# Altium schematic symbol library jlcpcb_2025_04_capacitors_extended_0402.schlib: 3594 symbols (part 14 of 20) (continued)
## GJM1555C1H3R6CB01D
designator C?  Capacitance: 3.6pF  (hidden comment: *)
Capacitor, Ceramic (MLCC), 3.6pF, 50V, C0G, SMD 0402; Manufacturer: Murata Electronics; Manufacturer Part Number: GJM1555C1H3R6CB01D; Package Size: 0402; JLCPCB Basic Part: No; JLCPCB Part Number: C85882; Supplier 1: LCSC; Category: Capacitors - MLCC; Supplier Part Number 1: C85882; Voltage Rating: 50V; Temperature Coefficient: C0G; RoHS: Yes; ComponentLink1Description: Datasheet; ComponentLink1URL: https://wmsc.lcsc.com/wmsc/upload/file/pdf/v2/lcsc/2304140030_Murata-Electronics-GJM1555C1H3R6CB01D_C85882.pdf; ComponentLink2Description: JLCPCB Part URL; ComponentLink2URL: https://jlcpcb.com/partdetail/C85882; ComponentLink3Description: LCSC Part URL; ComponentLink3URL: https://lcsc.com/product-detail/Multilayer-Ceramic-Capacitors-MLCC---SMD-SMT_Murata-Electronics-Murata-Electronics-GJM1555C1H3R6CB01D_C85882.html
footprint CAP-0402 (0402 (1005M) Capacitor)
pins: 1, 2

## GJM1555C1H3R6WB01D
designator C?  Capacitance: 3.6pF  (hidden comment: *)
Capacitor, Ceramic (MLCC), 3.6pF, 50V, C0G, SMD 0402; Manufacturer: Murata Electronics; Manufacturer Part Number: GJM1555C1H3R6WB01D; Package Size: 0402; JLCPCB Basic Part: No; JLCPCB Part Number: C161321; Supplier 1: LCSC; Category: Capacitors - MLCC; Supplier Part Number 1: C161321; Voltage Rating: 50V; Temperature Coefficient: C0G; RoHS: Yes; ComponentLink1Description: Datasheet; ComponentLink1URL: https://wmsc.lcsc.com/wmsc/upload/file/pdf/v2/lcsc/1811081521_Murata-Electronics-GJM1555C1H3R6WB01D_C161321.pdf; ComponentLink2Description: JLCPCB Part URL; ComponentLink2URL: https://jlcpcb.com/partdetail/C161321; ComponentLink3Description: LCSC Part URL; ComponentLink3URL: https://lcsc.com/product-detail/Multilayer-Ceramic-Capacitors-MLCC---SMD-SMT_Murata-Electronics-Murata-Electronics-GJM1555C1H3R6WB01D_C161321.html
footprint CAP-0402 (0402 (1005M) Capacitor)
pins: 1, 2

## GJM1555C1H3R9BB01D
designator C?  Capacitance: 3.9pF  (hidden comment: *)
Capacitor, Ceramic (MLCC), 3.9pF, 50V, C0G, SMD 0402; Manufacturer: Murata Electronics; Manufacturer Part Number: GJM1555C1H3R9BB01D; Package Size: 0402; JLCPCB Basic Part: No; JLCPCB Part Number: C76907; Supplier 1: LCSC; Category: Capacitors - MLCC; Supplier Part Number 1: C76907; Voltage Rating: 50V; Temperature Coefficient: C0G; RoHS: Yes; ComponentLink1Description: Datasheet; ComponentLink1URL: https://wmsc.lcsc.com/wmsc/upload/file/pdf/v2/lcsc/2304140030_Murata-Electronics-GJM1555C1H3R9BB01D_C76907.pdf; ComponentLink2Description: JLCPCB Part URL; ComponentLink2URL: https://jlcpcb.com/partdetail/C76907; ComponentLink3Description: LCSC Part URL; ComponentLink3URL: https://lcsc.com/product-detail/Multilayer-Ceramic-Capacitors-MLCC---SMD-SMT_Murata-Electronics-Murata-Electronics-GJM1555C1H3R9BB01D_C76907.html
footprint CAP-0402 (0402 (1005M) Capacitor)
pins: 1, 2

## GJM1555C1H3R9CB01D
designator C?  Capacitance: 3.9pF  (hidden comment: *)
Capacitor, Ceramic (MLCC), 3.9pF, 50V, C0G, SMD 0402; Manufacturer: Murata Electronics; Manufacturer Part Number: GJM1555C1H3R9CB01D; Package Size: 0402; JLCPCB Basic Part: No; JLCPCB Part Number: C237290; Supplier 1: LCSC; Category: Capacitors - MLCC; Supplier Part Number 1: C237290; Voltage Rating: 50V; Temperature Coefficient: C0G; RoHS: Yes; ComponentLink1Description: Datasheet; ComponentLink1URL: https://wmsc.lcsc.com/wmsc/upload/file/pdf/v2/lcsc/2304140030_Murata-Electronics-GJM1555C1H3R9CB01D_C237290.pdf; ComponentLink2Description: JLCPCB Part URL; ComponentLink2URL: https://jlcpcb.com/partdetail/C237290; ComponentLink3Description: LCSC Part URL; ComponentLink3URL: https://lcsc.com/product-detail/Multilayer-Ceramic-Capacitors-MLCC---SMD-SMT_Murata-Electronics-Murata-Electronics-GJM1555C1H3R9CB01D_C237290.html
footprint CAP-0402 (0402 (1005M) Capacitor)
pins: 1, 2

## GJM1555C1H3R9WB01D
designator C?  Capacitance: 3.9pF  (hidden comment: *)
Capacitor, Ceramic (MLCC), 3.9pF, 50V, C0G, SMD 0402; Manufacturer: Murata Electronics; Manufacturer Part Number: GJM1555C1H3R9WB01D; Package Size: 0402; JLCPCB Basic Part: No; JLCPCB Part Number: C88893; Supplier 1: LCSC; Category: Capacitors - MLCC; Supplier Part Number 1: C88893; Voltage Rating: 50V; Temperature Coefficient: C0G; RoHS: Yes; ComponentLink1Description: Datasheet; ComponentLink1URL: https://wmsc.lcsc.com/wmsc/upload/file/pdf/v2/lcsc/2304140030_Murata-Electronics-GJM1555C1H3R9WB01D_C88893.pdf; ComponentLink2Description: JLCPCB Part URL; ComponentLink2URL: https://jlcpcb.com/partdetail/C88893; ComponentLink3Description: LCSC Part URL; ComponentLink3URL: https://lcsc.com/product-detail/Multilayer-Ceramic-Capacitors-MLCC---SMD-SMT_Murata-Electronics-Murata-Electronics-GJM1555C1H3R9WB01D_C88893.html
footprint CAP-0402 (0402 (1005M) Capacitor)
pins: 1, 2

## GJM1555C1H4R0BB01D
designator C?  Capacitance: 4pF  (hidden comment: *)
Capacitor, Ceramic (MLCC), 4pF, 50V, C0G, SMD 0402; Manufacturer: Murata Electronics; Manufacturer Part Number: GJM1555C1H4R0BB01D; Package Size: 0402; JLCPCB Basic Part: No; JLCPCB Part Number: C161323; Supplier 1: LCSC; Category: Capacitors - MLCC; Supplier Part Number 1: C161323; Voltage Rating: 50V; Temperature Coefficient: C0G; RoHS: Yes; ComponentLink1Description: Datasheet; ComponentLink1URL: https://wmsc.lcsc.com/wmsc/upload/file/pdf/v2/lcsc/1811081521_Murata-Electronics-GJM1555C1H4R0BB01D_C161323.pdf; ComponentLink2Description: JLCPCB Part URL; ComponentLink2URL: https://jlcpcb.com/partdetail/C161323; ComponentLink3Description: LCSC Part URL; ComponentLink3URL: https://lcsc.com/product-detail/Multilayer-Ceramic-Capacitors-MLCC---SMD-SMT_Murata-Electronics-Murata-Electronics-GJM1555C1H4R0BB01D_C161323.html
footprint CAP-0402 (0402 (1005M) Capacitor)
pins: 1, 2

## GJM1555C1H4R0CB01D
designator C?  Capacitance: 4pF  (hidden comment: *)
Capacitor, Ceramic (MLCC), 4pF, 50V, C0G, SMD 0402; Manufacturer: Murata Electronics; Manufacturer Part Number: GJM1555C1H4R0CB01D; Package Size: 0402; JLCPCB Basic Part: No; JLCPCB Part Number: C161324; Supplier 1: LCSC; Category: Capacitors - MLCC; Supplier Part Number 1: C161324; Voltage Rating: 50V; Temperature Coefficient: C0G; RoHS: Yes; ComponentLink1Description: Datasheet; ComponentLink1URL: https://wmsc.lcsc.com/wmsc/upload/file/pdf/v2/lcsc/2304140030_Murata-Electronics-GJM1555C1H4R0CB01D_C161324.pdf; ComponentLink2Description: JLCPCB Part URL; ComponentLink2URL: https://jlcpcb.com/partdetail/C161324; ComponentLink3Description: LCSC Part URL; ComponentLink3URL: https://lcsc.com/product-detail/Multilayer-Ceramic-Capacitors-MLCC---SMD-SMT_Murata-Electronics-Murata-Electronics-GJM1555C1H4R0CB01D_C161324.html
footprint CAP-0402 (0402 (1005M) Capacitor)
pins: 1, 2

## GJM1555C1H4R0WB01D
designator C?  Capacitance: 4pF  (hidden comment: *)
Capacitor, Ceramic (MLCC), 4pF, null, null, SMD 0402; Manufacturer: Murata Electronics; Manufacturer Part Number: GJM1555C1H4R0WB01D; Package Size: 0402; JLCPCB Basic Part: No; JLCPCB Part Number: C883563; Supplier 1: LCSC; Category: Capacitors - MLCC; Supplier Part Number 1: C883563; Voltage Rating: null; Temperature Coefficient: null; RoHS: Yes; ComponentLink1Description: Datasheet; ComponentLink1URL: https://wmsc.lcsc.com/wmsc/upload/file/pdf/v2/lcsc/2012231842_Murata-Electronics-GJM1555C1H4R0WB01D_C883563.pdf; ComponentLink2Description: JLCPCB Part URL; ComponentLink2URL: https://jlcpcb.com/partdetail/C883563; ComponentLink3Description: LCSC Part URL; ComponentLink3URL: https://lcsc.com/product-detail/Multilayer-Ceramic-Capacitors-MLCC---SMD-SMT_Murata-Electronics-Murata-Electronics-GJM1555C1H4R0WB01D_C883563.html
footprint CAP-0402 (0402 (1005M) Capacitor)
pins: 1, 2

## GJM1555C1H4R3BB01D
designator C?  Capacitance: 4.3pF  (hidden comment: *)
Capacitor, Ceramic (MLCC), 4.3pF, null, null, SMD 0402; Manufacturer: Murata Electronics; Manufacturer Part Number: GJM1555C1H4R3BB01D; Package Size: 0402; JLCPCB Basic Part: No; JLCPCB Part Number: C426034; Supplier 1: LCSC; Category: Capacitors - MLCC; Supplier Part Number 1: C426034; Voltage Rating: null; Temperature Coefficient: null; RoHS: Yes; ComponentLink1Description: Datasheet; ComponentLink1URL: https://wmsc.lcsc.com/wmsc/upload/file/pdf/v2/lcsc/2304140030_Murata-Electronics-GJM1555C1H4R3BB01D_C426034.pdf; ComponentLink2Description: JLCPCB Part URL; ComponentLink2URL: https://jlcpcb.com/partdetail/C426034; ComponentLink3Description: LCSC Part URL; ComponentLink3URL: https://lcsc.com/product-detail/Multilayer-Ceramic-Capacitors-MLCC---SMD-SMT_Murata-Electronics-Murata-Electronics-GJM1555C1H4R3BB01D_C426034.html
footprint CAP-0402 (0402 (1005M) Capacitor)
pins: 1, 2

## GJM1555C1H4R3CB01D
designator C?  Capacitance: 4.3pF  (hidden comment: *)
Capacitor, Ceramic (MLCC), 4.3pF, 50V, C0G, SMD 0402; Manufacturer: Murata Electronics; Manufacturer Part Number: GJM1555C1H4R3CB01D; Package Size: 0402; JLCPCB Basic Part: No; JLCPCB Part Number: C161325; Supplier 1: LCSC; Category: Capacitors - MLCC; Supplier Part Number 1: C161325; Voltage Rating: 50V; Temperature Coefficient: C0G; RoHS: Yes; ComponentLink1Description: Datasheet; ComponentLink1URL: https://wmsc.lcsc.com/wmsc/upload/file/pdf/v2/lcsc/2304140030_Murata-Electronics-GJM1555C1H4R3CB01D_C161325.pdf; ComponentLink2Description: JLCPCB Part URL; ComponentLink2URL: https://jlcpcb.com/partdetail/C161325; ComponentLink3Description: LCSC Part URL; ComponentLink3URL: https://lcsc.com/product-detail/Multilayer-Ceramic-Capacitors-MLCC---SMD-SMT_Murata-Electronics-Murata-Electronics-GJM1555C1H4R3CB01D_C161325.html
footprint CAP-0402 (0402 (1005M) Capacitor)
pins: 1, 2

## GJM1555C1H4R3WB01D
designator C?  Capacitance: 4.3pF  (hidden comment: *)
Capacitor, Ceramic (MLCC), 4.3pF, 50V, C0G, SMD 0402; Manufacturer: Murata Electronics; Manufacturer Part Number: GJM1555C1H4R3WB01D; Package Size: 0402; JLCPCB Basic Part: No; JLCPCB Part Number: C161326; Supplier 1: LCSC; Category: Capacitors - MLCC; Supplier Part Number 1: C161326; Voltage Rating: 50V; Temperature Coefficient: C0G; RoHS: Yes; ComponentLink1Description: Datasheet; ComponentLink1URL: https://wmsc.lcsc.com/wmsc/upload/file/pdf/v2/lcsc/2304140030_Murata-Electronics-GJM1555C1H4R3WB01D_C161326.pdf; ComponentLink2Description: JLCPCB Part URL; ComponentLink2URL: https://jlcpcb.com/partdetail/C161326; ComponentLink3Description: LCSC Part URL; ComponentLink3URL: https://lcsc.com/product-detail/Multilayer-Ceramic-Capacitors-MLCC---SMD-SMT_Murata-Electronics-Murata-Electronics-GJM1555C1H4R3WB01D_C161326.html
footprint CAP-0402 (0402 (1005M) Capacitor)
pins: 1, 2

## GJM1555C1H4R4BB01D
designator C?  Capacitance: 4.4pF  (hidden comment: *)
Capacitor, Ceramic (MLCC), 4.4pF, 50V, null, SMD 0402; Manufacturer: Murata Electronics; Manufacturer Part Number: GJM1555C1H4R4BB01D; Package Size: 0402; JLCPCB Basic Part: No; JLCPCB Part Number: C2203151; Supplier 1: LCSC; Category: Capacitors - MLCC; Supplier Part Number 1: C2203151; Voltage Rating: 50V; Temperature Coefficient: null; RoHS: Yes; ComponentLink1Description: Datasheet; ComponentLink1URL: https://wmsc.lcsc.com/wmsc/upload/file/pdf/v2/lcsc/2104170907_Murata-Electronics-GJM1555C1H4R4BB01D_C2203151.pdf; ComponentLink2Description: JLCPCB Part URL; ComponentLink2URL: https://jlcpcb.com/partdetail/C2203151; ComponentLink3Description: LCSC Part URL; ComponentLink3URL: https://lcsc.com/product-detail/Multilayer-Ceramic-Capacitors-MLCC---SMD-SMT_Murata-Electronics-Murata-Electronics-GJM1555C1H4R4BB01D_C2203151.html
footprint CAP-0402 (0402 (1005M) Capacitor)
pins: 1, 2

## GJM1555C1H4R5BB01D
designator C?  Capacitance: 4.5pF  (hidden comment: *)
Capacitor, Ceramic (MLCC), 4.5pF, 50V, C0G, SMD 0402; Manufacturer: Murata Electronics; Manufacturer Part Number: GJM1555C1H4R5BB01D; Package Size: 0402; JLCPCB Basic Part: No; JLCPCB Part Number: C882561; Supplier 1: LCSC; Category: Capacitors - MLCC; Supplier Part Number 1: C882561; Voltage Rating: 50V; Temperature Coefficient: C0G; RoHS: Yes; ComponentLink1Description: Datasheet; ComponentLink1URL: https://wmsc.lcsc.com/wmsc/upload/file/pdf/v2/lcsc/2201242130_Murata-Electronics-GJM1555C1H4R5BB01D_C882561.pdf; ComponentLink2Description: JLCPCB Part URL; ComponentLink2URL: https://jlcpcb.com/partdetail/C882561; ComponentLink3Description: LCSC Part URL; ComponentLink3URL: https://lcsc.com/product-detail/Multilayer-Ceramic-Capacitors-MLCC---SMD-SMT_Murata-Electronics-Murata-Electronics-GJM1555C1H4R5BB01D_C882561.html
footprint CAP-0402 (0402 (1005M) Capacitor)
pins: 1, 2

## GJM1555C1H4R7BB01D
designator C?  Capacitance: 4.7pF  (hidden comment: *)
Capacitor, Ceramic (MLCC), 4.7pF, 50V, C0G, SMD 0402; Manufacturer: Murata Electronics; Manufacturer Part Number: GJM1555C1H4R7BB01D; Package Size: 0402; JLCPCB Basic Part: No; JLCPCB Part Number: C161327; Supplier 1: LCSC; Category: Capacitors - MLCC; Supplier Part Number 1: C161327; Voltage Rating: 50V; Temperature Coefficient: C0G; RoHS: Yes; ComponentLink1Description: Datasheet; ComponentLink1URL: https://wmsc.lcsc.com/wmsc/upload/file/pdf/v2/lcsc/1811081617_Murata-Electronics-GJM1555C1H4R7BB01D_C161327.pdf; ComponentLink2Description: JLCPCB Part URL; ComponentLink2URL: https://jlcpcb.com/partdetail/C161327; ComponentLink3Description: LCSC Part URL; ComponentLink3URL: https://lcsc.com/product-detail/Multilayer-Ceramic-Capacitors-MLCC---SMD-SMT_Murata-Electronics-Murata-Electronics-GJM1555C1H4R7BB01D_C161327.html
footprint CAP-0402 (0402 (1005M) Capacitor)
pins: 1, 2

## GJM1555C1H4R7CB01D
designator C?  Capacitance: 4.7pF  (hidden comment: *)
Capacitor, Ceramic (MLCC), 4.7pF, 50V, SMD 0402; Manufacturer: Murata Electronics; Manufacturer Part Number: GJM1555C1H4R7CB01D; Package Size: 0402; JLCPCB Basic Part: No; JLCPCB Part Number: C85883; Supplier 1: LCSC; Category: Capacitors - MLCC; Supplier Part Number 1: C85883; Voltage Rating: 50V; RoHS: Yes; ComponentLink1Description: Datasheet; ComponentLink1URL: https://wmsc.lcsc.com/wmsc/upload/file/pdf/v2/lcsc/2304140030_Murata-Electronics-GJM1555C1H4R7CB01D_C85883.pdf; ComponentLink2Description: JLCPCB Part URL; ComponentLink2URL: https://jlcpcb.com/partdetail/C85883; ComponentLink3Description: LCSC Part URL; ComponentLink3URL: https://lcsc.com/product-detail/Multilayer-Ceramic-Capacitors-MLCC---SMD-SMT_Murata-Electronics-Murata-Electronics-GJM1555C1H4R7CB01D_C85883.html
footprint CAP-0402 (0402 (1005M) Capacitor)
pins: 1, 2

## GJM1555C1H4R7WB01D
designator C?  Capacitance: 4.7pF  (hidden comment: *)
Capacitor, Ceramic (MLCC), 4.7pF, 50V, C0G, SMD 0402; Manufacturer: Murata Electronics; Manufacturer Part Number: GJM1555C1H4R7WB01D; Package Size: 0402; JLCPCB Basic Part: No; JLCPCB Part Number: C88894; Supplier 1: LCSC; Category: Capacitors - MLCC; Supplier Part Number 1: C88894; Voltage Rating: 50V; Temperature Coefficient: C0G; RoHS: Yes; ComponentLink1Description: Datasheet; ComponentLink1URL: https://wmsc.lcsc.com/wmsc/upload/file/pdf/v2/lcsc/2304140030_Murata-Electronics-GJM1555C1H4R7WB01D_C88894.pdf; ComponentLink2Description: JLCPCB Part URL; ComponentLink2URL: https://jlcpcb.com/partdetail/C88894; ComponentLink3Description: LCSC Part URL; ComponentLink3URL: https://lcsc.com/product-detail/Multilayer-Ceramic-Capacitors-MLCC---SMD-SMT_Murata-Electronics-Murata-Electronics-GJM1555C1H4R7WB01D_C88894.html
footprint CAP-0402 (0402 (1005M) Capacitor)
pins: 1, 2

## GJM1555C1H5R0BB01D
designator C?  Capacitance: 5pF  (hidden comment: *)
Capacitor, Ceramic (MLCC), 5pF, 50V, C0G, SMD 0402; Manufacturer: Murata Electronics; Manufacturer Part Number: GJM1555C1H5R0BB01D; Package Size: 0402; JLCPCB Basic Part: No; JLCPCB Part Number: C161328; Supplier 1: LCSC; Category: Capacitors - MLCC; Supplier Part Number 1: C161328; Voltage Rating: 50V; Temperature Coefficient: C0G; RoHS: Yes; ComponentLink1Description: Datasheet; ComponentLink1URL: https://wmsc.lcsc.com/wmsc/upload/file/pdf/v2/lcsc/2304140030_Murata-Electronics-GJM1555C1H5R0BB01D_C161328.pdf; ComponentLink2Description: JLCPCB Part URL; ComponentLink2URL: https://jlcpcb.com/partdetail/C161328; ComponentLink3Description: LCSC Part URL; ComponentLink3URL: https://lcsc.com/product-detail/Multilayer-Ceramic-Capacitors-MLCC---SMD-SMT_Murata-Electronics-Murata-Electronics-GJM1555C1H5R0BB01D_C161328.html
footprint CAP-0402 (0402 (1005M) Capacitor)
pins: 1, 2

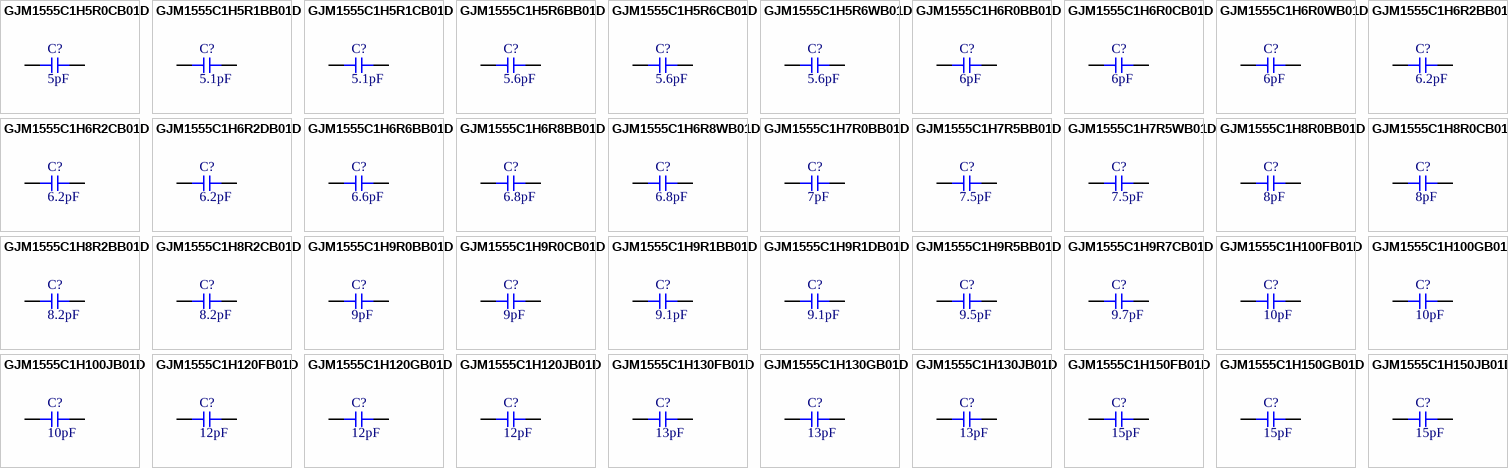
[diagram p63: symbols GJM1555C1H5R0CB01D to GJM1555C1H150JB01D]

## GJM1555C1H5R0CB01D
designator C?  Capacitance: 5pF  (hidden comment: *)
Capacitor, Ceramic (MLCC), 5pF, 50V, C0G, SMD 0402; Manufacturer: Murata Electronics; Manufacturer Part Number: GJM1555C1H5R0CB01D; Package Size: 0402; JLCPCB Basic Part: No; JLCPCB Part Number: C497525; Supplier 1: LCSC; Category: Capacitors - MLCC; Supplier Part Number 1: C497525; Voltage Rating: 50V; Temperature Coefficient: C0G; RoHS: Yes; ComponentLink1Description: Datasheet; ComponentLink1URL: https://wmsc.lcsc.com/wmsc/upload/file/pdf/v2/lcsc/2304140030_Murata-Electronics-GJM1555C1H5R0CB01D_C497525.pdf; ComponentLink2Description: JLCPCB Part URL; ComponentLink2URL: https://jlcpcb.com/partdetail/C497525; ComponentLink3Description: LCSC Part URL; ComponentLink3URL: https://lcsc.com/product-detail/Multilayer-Ceramic-Capacitors-MLCC---SMD-SMT_Murata-Electronics-Murata-Electronics-GJM1555C1H5R0CB01D_C497525.html
footprint CAP-0402 (0402 (1005M) Capacitor)
pins: 1, 2

## GJM1555C1H5R1BB01D
designator C?  Capacitance: 5.1pF  (hidden comment: *)
Capacitor, Ceramic (MLCC), 5.1pF, 50V, C0G, SMD 0402; Manufacturer: Murata Electronics; Manufacturer Part Number: GJM1555C1H5R1BB01D; Package Size: 0402; JLCPCB Basic Part: No; JLCPCB Part Number: C237535; Supplier 1: LCSC; Category: Capacitors - MLCC; Supplier Part Number 1: C237535; Voltage Rating: 50V; Temperature Coefficient: C0G; RoHS: Yes; ComponentLink1Description: Datasheet; ComponentLink1URL: https://wmsc.lcsc.com/wmsc/upload/file/pdf/v2/lcsc/1912111437_Murata-Electronics-GJM1555C1H5R1BB01D_C237535.pdf; ComponentLink2Description: JLCPCB Part URL; ComponentLink2URL: https://jlcpcb.com/partdetail/C237535; ComponentLink3Description: LCSC Part URL; ComponentLink3URL: https://lcsc.com/product-detail/Multilayer-Ceramic-Capacitors-MLCC---SMD-SMT_Murata-Electronics-Murata-Electronics-GJM1555C1H5R1BB01D_C237535.html
footprint CAP-0402 (0402 (1005M) Capacitor)
pins: 1, 2

## GJM1555C1H5R1CB01D
designator C?  Capacitance: 5.1pF  (hidden comment: *)
Capacitor, Ceramic (MLCC), 5.1pF, null, null, SMD 0402; Manufacturer: Murata Electronics; Manufacturer Part Number: GJM1555C1H5R1CB01D; Package Size: 0402; JLCPCB Basic Part: No; JLCPCB Part Number: C882560; Supplier 1: LCSC; Category: Capacitors - MLCC; Supplier Part Number 1: C882560; Voltage Rating: null; Temperature Coefficient: null; RoHS: Yes; ComponentLink1Description: Datasheet; ComponentLink1URL: https://wmsc.lcsc.com/wmsc/upload/file/pdf/v2/lcsc/2201242130_Murata-Electronics-GJM1555C1H5R1CB01D_C882560.pdf; ComponentLink2Description: JLCPCB Part URL; ComponentLink2URL: https://jlcpcb.com/partdetail/C882560; ComponentLink3Description: LCSC Part URL; ComponentLink3URL: https://lcsc.com/product-detail/Multilayer-Ceramic-Capacitors-MLCC---SMD-SMT_Murata-Electronics-Murata-Electronics-GJM1555C1H5R1CB01D_C882560.html
footprint CAP-0402 (0402 (1005M) Capacitor)
pins: 1, 2

## GJM1555C1H5R6BB01D
designator C?  Capacitance: 5.6pF  (hidden comment: *)
Capacitor, Ceramic (MLCC), 5.6pF, 50V, C0G, SMD 0402; Manufacturer: Murata Electronics; Manufacturer Part Number: GJM1555C1H5R6BB01D; Package Size: 0402; JLCPCB Basic Part: No; JLCPCB Part Number: C161329; Supplier 1: LCSC; Category: Capacitors - MLCC; Supplier Part Number 1: C161329; Voltage Rating: 50V; Temperature Coefficient: C0G; RoHS: Yes; ComponentLink1Description: Datasheet; ComponentLink1URL: https://wmsc.lcsc.com/wmsc/upload/file/pdf/v2/lcsc/1811081513_Murata-Electronics-GJM1555C1H5R6BB01D_C161329.pdf; ComponentLink2Description: JLCPCB Part URL; ComponentLink2URL: https://jlcpcb.com/partdetail/C161329; ComponentLink3Description: LCSC Part URL; ComponentLink3URL: https://lcsc.com/product-detail/Multilayer-Ceramic-Capacitors-MLCC---SMD-SMT_Murata-Electronics-Murata-Electronics-GJM1555C1H5R6BB01D_C161329.html
footprint CAP-0402 (0402 (1005M) Capacitor)
pins: 1, 2

## GJM1555C1H5R6CB01D
designator C?  Capacitance: 5.6pF  (hidden comment: *)
Capacitor, Ceramic (MLCC), 5.6pF, 50V, C0G, SMD 0402; Manufacturer: Murata Electronics; Manufacturer Part Number: GJM1555C1H5R6CB01D; Package Size: 0402; JLCPCB Basic Part: No; JLCPCB Part Number: C88895; Supplier 1: LCSC; Category: Capacitors - MLCC; Supplier Part Number 1: C88895; Voltage Rating: 50V; Temperature Coefficient: C0G; RoHS: Yes; ComponentLink1Description: Datasheet; ComponentLink1URL: https://wmsc.lcsc.com/wmsc/upload/file/pdf/v2/lcsc/2304140030_Murata-Electronics-GJM1555C1H5R6CB01D_C88895.pdf; ComponentLink2Description: JLCPCB Part URL; ComponentLink2URL: https://jlcpcb.com/partdetail/C88895; ComponentLink3Description: LCSC Part URL; ComponentLink3URL: https://lcsc.com/product-detail/Multilayer-Ceramic-Capacitors-MLCC---SMD-SMT_Murata-Electronics-Murata-Electronics-GJM1555C1H5R6CB01D_C88895.html
footprint CAP-0402 (0402 (1005M) Capacitor)
pins: 1, 2

## GJM1555C1H5R6WB01D
designator C?  Capacitance: 5.6pF  (hidden comment: *)
Capacitor, Ceramic (MLCC), 5.6pF, null, null, SMD 0402; Manufacturer: Murata Electronics; Manufacturer Part Number: GJM1555C1H5R6WB01D; Package Size: 0402; JLCPCB Basic Part: No; JLCPCB Part Number: C882559; Supplier 1: LCSC; Category: Capacitors - MLCC; Supplier Part Number 1: C882559; Voltage Rating: null; Temperature Coefficient: null; RoHS: Yes; ComponentLink1Description: Datasheet; ComponentLink1URL: https://wmsc.lcsc.com/wmsc/upload/file/pdf/v2/lcsc/2201242130_Murata-Electronics-GJM1555C1H5R6WB01D_C882559.pdf; ComponentLink2Description: JLCPCB Part URL; ComponentLink2URL: https://jlcpcb.com/partdetail/C882559; ComponentLink3Description: LCSC Part URL; ComponentLink3URL: https://lcsc.com/product-detail/Multilayer-Ceramic-Capacitors-MLCC---SMD-SMT_Murata-Electronics-Murata-Electronics-GJM1555C1H5R6WB01D_C882559.html
footprint CAP-0402 (0402 (1005M) Capacitor)
pins: 1, 2

## GJM1555C1H6R0BB01D
designator C?  Capacitance: 6pF  (hidden comment: *)
Capacitor, Ceramic (MLCC), 6pF, null, null, SMD 0402; Manufacturer: Murata Electronics; Manufacturer Part Number: GJM1555C1H6R0BB01D; Package Size: 0402; JLCPCB Basic Part: No; JLCPCB Part Number: C882558; Supplier 1: LCSC; Category: Capacitors - MLCC; Supplier Part Number 1: C882558; Voltage Rating: null; Temperature Coefficient: null; RoHS: Yes; ComponentLink1Description: Datasheet; ComponentLink1URL: https://wmsc.lcsc.com/wmsc/upload/file/pdf/v2/lcsc/2201242130_Murata-Electronics-GJM1555C1H6R0BB01D_C882558.pdf; ComponentLink2Description: JLCPCB Part URL; ComponentLink2URL: https://jlcpcb.com/partdetail/C882558; ComponentLink3Description: LCSC Part URL; ComponentLink3URL: https://lcsc.com/product-detail/Multilayer-Ceramic-Capacitors-MLCC---SMD-SMT_Murata-Electronics-Murata-Electronics-GJM1555C1H6R0BB01D_C882558.html
footprint CAP-0402 (0402 (1005M) Capacitor)
pins: 1, 2

## GJM1555C1H6R0CB01D
designator C?  Capacitance: 6pF  (hidden comment: *)
Capacitor, Ceramic (MLCC), 6pF, 50V, C0G, SMD 0402; Manufacturer: Murata Electronics; Manufacturer Part Number: GJM1555C1H6R0CB01D; Package Size: 0402; JLCPCB Basic Part: No; JLCPCB Part Number: C161330; Supplier 1: LCSC; Category: Capacitors - MLCC; Supplier Part Number 1: C161330; Voltage Rating: 50V; Temperature Coefficient: C0G; RoHS: Yes; ComponentLink1Description: Datasheet; ComponentLink1URL: https://wmsc.lcsc.com/wmsc/upload/file/pdf/v2/lcsc/2304140030_Murata-Electronics-GJM1555C1H6R0CB01D_C161330.pdf; ComponentLink2Description: JLCPCB Part URL; ComponentLink2URL: https://jlcpcb.com/partdetail/C161330; ComponentLink3Description: LCSC Part URL; ComponentLink3URL: https://lcsc.com/product-detail/Multilayer-Ceramic-Capacitors-MLCC---SMD-SMT_Murata-Electronics-Murata-Electronics-GJM1555C1H6R0CB01D_C161330.html
footprint CAP-0402 (0402 (1005M) Capacitor)
pins: 1, 2

## GJM1555C1H6R0WB01D
designator C?  Capacitance: 6pF  (hidden comment: *)
Capacitor, Ceramic (MLCC), 6pF, 50V, null, SMD 0402; Manufacturer: Murata Electronics; Manufacturer Part Number: GJM1555C1H6R0WB01D; Package Size: 0402; JLCPCB Basic Part: No; JLCPCB Part Number: C882557; Supplier 1: LCSC; Category: Capacitors - MLCC; Supplier Part Number 1: C882557; Voltage Rating: 50V; Temperature Coefficient: null; RoHS: Yes; ComponentLink1Description: Datasheet; ComponentLink1URL: https://wmsc.lcsc.com/wmsc/upload/file/pdf/v2/lcsc/2201242130_Murata-Electronics-GJM1555C1H6R0WB01D_C882557.pdf; ComponentLink2Description: JLCPCB Part URL; ComponentLink2URL: https://jlcpcb.com/partdetail/C882557; ComponentLink3Description: LCSC Part URL; ComponentLink3URL: https://lcsc.com/product-detail/Multilayer-Ceramic-Capacitors-MLCC---SMD-SMT_Murata-Electronics-Murata-Electronics-GJM1555C1H6R0WB01D_C882557.html
footprint CAP-0402 (0402 (1005M) Capacitor)
pins: 1, 2

## GJM1555C1H6R2BB01D
designator C?  Capacitance: 6.2pF  (hidden comment: *)
Capacitor, Ceramic (MLCC), 6.2pF, 50V, C0G, SMD 0402; Manufacturer: Murata Electronics; Manufacturer Part Number: GJM1555C1H6R2BB01D; Package Size: 0402; JLCPCB Basic Part: No; JLCPCB Part Number: C161331; Supplier 1: LCSC; Category: Capacitors - MLCC; Supplier Part Number 1: C161331; Voltage Rating: 50V; Temperature Coefficient: C0G; RoHS: Yes; ComponentLink1Description: Datasheet; ComponentLink1URL: https://wmsc.lcsc.com/wmsc/upload/file/pdf/v2/lcsc/2304140030_Murata-Electronics-GJM1555C1H6R2BB01D_C161331.pdf; ComponentLink2Description: JLCPCB Part URL; ComponentLink2URL: https://jlcpcb.com/partdetail/C161331; ComponentLink3Description: LCSC Part URL; ComponentLink3URL: https://lcsc.com/product-detail/Multilayer-Ceramic-Capacitors-MLCC---SMD-SMT_Murata-Electronics-Murata-Electronics-GJM1555C1H6R2BB01D_C161331.html
footprint CAP-0402 (0402 (1005M) Capacitor)
pins: 1, 2

## GJM1555C1H6R2CB01D
designator C?  Capacitance: 6.2pF  (hidden comment: *)
Capacitor, Ceramic (MLCC), 6.2pF, 50V, C0G, SMD 0402; Manufacturer: Murata Electronics; Manufacturer Part Number: GJM1555C1H6R2CB01D; Package Size: 0402; JLCPCB Basic Part: No; JLCPCB Part Number: C415542; Supplier 1: LCSC; Category: Capacitors - MLCC; Supplier Part Number 1: C415542; Voltage Rating: 50V; Temperature Coefficient: C0G; RoHS: Yes; ComponentLink1Description: Datasheet; ComponentLink1URL: https://wmsc.lcsc.com/wmsc/upload/file/pdf/v2/lcsc/2304140030_Murata-Electronics-GJM1555C1H6R2CB01D_C415542.pdf; ComponentLink2Description: JLCPCB Part URL; ComponentLink2URL: https://jlcpcb.com/partdetail/C415542; ComponentLink3Description: LCSC Part URL; ComponentLink3URL: https://lcsc.com/product-detail/Multilayer-Ceramic-Capacitors-MLCC---SMD-SMT_Murata-Electronics-Murata-Electronics-GJM1555C1H6R2CB01D_C415542.html
footprint CAP-0402 (0402 (1005M) Capacitor)
pins: 1, 2

## GJM1555C1H6R2DB01D
designator C?  Capacitance: 6.2pF  (hidden comment: *)
Capacitor, Ceramic (MLCC), 6.2pF, 50V, C0G, SMD 0402; Manufacturer: Murata Electronics; Manufacturer Part Number: GJM1555C1H6R2DB01D; Package Size: 0402; JLCPCB Basic Part: No; JLCPCB Part Number: C161332; Supplier 1: LCSC; Category: Capacitors - MLCC; Supplier Part Number 1: C161332; Voltage Rating: 50V; Temperature Coefficient: C0G; RoHS: Yes; ComponentLink1Description: Datasheet; ComponentLink1URL: https://wmsc.lcsc.com/wmsc/upload/file/pdf/v2/lcsc/2304140030_Murata-Electronics-GJM1555C1H6R2DB01D_C161332.pdf; ComponentLink2Description: JLCPCB Part URL; ComponentLink2URL: https://jlcpcb.com/partdetail/C161332; ComponentLink3Description: LCSC Part URL; ComponentLink3URL: https://lcsc.com/product-detail/Multilayer-Ceramic-Capacitors-MLCC---SMD-SMT_Murata-Electronics-Murata-Electronics-GJM1555C1H6R2DB01D_C161332.html
footprint CAP-0402 (0402 (1005M) Capacitor)
pins: 1, 2

## GJM1555C1H6R6BB01D
designator C?  Capacitance: 6.6pF  (hidden comment: *)
Capacitor, Ceramic (MLCC), 6.6pF, 50V, null, SMD 0402; Manufacturer: Murata Electronics; Manufacturer Part Number: GJM1555C1H6R6BB01D; Package Size: 0402; JLCPCB Basic Part: No; JLCPCB Part Number: C2176222; Supplier 1: LCSC; Category: Capacitors - MLCC; Supplier Part Number 1: C2176222; Voltage Rating: 50V; Temperature Coefficient: null; RoHS: Yes; ComponentLink1Description: Datasheet; ComponentLink1URL: https://wmsc.lcsc.com/wmsc/upload/file/pdf/v2/lcsc/2202040800_Murata-Electronics-GJM1555C1H6R6BB01D_C2176222.pdf; ComponentLink2Description: JLCPCB Part URL; ComponentLink2URL: https://jlcpcb.com/partdetail/C2176222; ComponentLink3Description: LCSC Part URL; ComponentLink3URL: https://lcsc.com/product-detail/Multilayer-Ceramic-Capacitors-MLCC---SMD-SMT_Murata-Electronics-Murata-Electronics-GJM1555C1H6R6BB01D_C2176222.html
footprint CAP-0402 (0402 (1005M) Capacitor)
pins: 1, 2

## GJM1555C1H6R8BB01D
designator C?  Capacitance: 6.8pF  (hidden comment: *)
Capacitor, Ceramic (MLCC), 6.8pF, 50V, C0G, SMD 0402; Manufacturer: Murata Electronics; Manufacturer Part Number: GJM1555C1H6R8BB01D; Package Size: 0402; JLCPCB Basic Part: No; JLCPCB Part Number: C88896; Supplier 1: LCSC; Category: Capacitors - MLCC; Supplier Part Number 1: C88896; Voltage Rating: 50V; Temperature Coefficient: C0G; RoHS: Yes; ComponentLink1Description: Datasheet; ComponentLink1URL: https://wmsc.lcsc.com/wmsc/upload/file/pdf/v2/lcsc/2304140030_Murata-Electronics-GJM1555C1H6R8BB01D_C88896.pdf; ComponentLink2Description: JLCPCB Part URL; ComponentLink2URL: https://jlcpcb.com/partdetail/C88896; ComponentLink3Description: LCSC Part URL; ComponentLink3URL: https://lcsc.com/product-detail/Multilayer-Ceramic-Capacitors-MLCC---SMD-SMT_Murata-Electronics-Murata-Electronics-GJM1555C1H6R8BB01D_C88896.html
footprint CAP-0402 (0402 (1005M) Capacitor)
pins: 1, 2

## GJM1555C1H6R8WB01D
designator C?  Capacitance: 6.8pF  (hidden comment: *)
Capacitor, Ceramic (MLCC), 6.8pF, 50V, null, SMD 0402; Manufacturer: Murata Electronics; Manufacturer Part Number: GJM1555C1H6R8WB01D; Package Size: 0402; JLCPCB Basic Part: No; JLCPCB Part Number: C2169817; Supplier 1: LCSC; Category: Capacitors - MLCC; Supplier Part Number 1: C2169817; Voltage Rating: 50V; Temperature Coefficient: null; RoHS: Yes; ComponentLink1Description: Datasheet; ComponentLink1URL: https://wmsc.lcsc.com/wmsc/upload/file/pdf/v2/lcsc/2108051630_Murata-Electronics-GJM1555C1H6R8WB01D_C2169817.pdf; ComponentLink2Description: JLCPCB Part URL; ComponentLink2URL: https://jlcpcb.com/partdetail/C2169817; ComponentLink3Description: LCSC Part URL; ComponentLink3URL: https://lcsc.com/product-detail/Multilayer-Ceramic-Capacitors-MLCC---SMD-SMT_Murata-Electronics-Murata-Electronics-GJM1555C1H6R8WB01D_C2169817.html
footprint CAP-0402 (0402 (1005M) Capacitor)
pins: 1, 2

## GJM1555C1H7R0BB01D
designator C?  Capacitance: 7pF  (hidden comment: *)
Capacitor, Ceramic (MLCC), 7pF, 50V, C0G, SMD 0402; Manufacturer: Murata Electronics; Manufacturer Part Number: GJM1555C1H7R0BB01D; Package Size: 0402; JLCPCB Basic Part: No; JLCPCB Part Number: C161333; Supplier 1: LCSC; Category: Capacitors - MLCC; Supplier Part Number 1: C161333; Voltage Rating: 50V; Temperature Coefficient: C0G; RoHS: Yes; ComponentLink1Description: Datasheet; ComponentLink1URL: https://wmsc.lcsc.com/wmsc/upload/file/pdf/v2/lcsc/2304140030_Murata-Electronics-GJM1555C1H7R0BB01D_C161333.pdf; ComponentLink2Description: JLCPCB Part URL; ComponentLink2URL: https://jlcpcb.com/partdetail/C161333; ComponentLink3Description: LCSC Part URL; ComponentLink3URL: https://lcsc.com/product-detail/Multilayer-Ceramic-Capacitors-MLCC---SMD-SMT_Murata-Electronics-Murata-Electronics-GJM1555C1H7R0BB01D_C161333.html
footprint CAP-0402 (0402 (1005M) Capacitor)
pins: 1, 2

## GJM1555C1H7R5BB01D
designator C?  Capacitance: 7.5pF  (hidden comment: *)
Capacitor, Ceramic (MLCC), 7.5pF, 50V, C0G, SMD 0402; Manufacturer: Murata Electronics; Manufacturer Part Number: GJM1555C1H7R5BB01D; Package Size: 0402; JLCPCB Basic Part: No; JLCPCB Part Number: C497526; Supplier 1: LCSC; Category: Capacitors - MLCC; Supplier Part Number 1: C497526; Voltage Rating: 50V; Temperature Coefficient: C0G; RoHS: Yes; ComponentLink1Description: Datasheet; ComponentLink1URL: https://wmsc.lcsc.com/wmsc/upload/file/pdf/v2/lcsc/2003172222_Murata-Electronics-GJM1555C1H7R5BB01D_C497526.pdf; ComponentLink2Description: JLCPCB Part URL; ComponentLink2URL: https://jlcpcb.com/partdetail/C497526; ComponentLink3Description: LCSC Part URL; ComponentLink3URL: https://lcsc.com/product-detail/Multilayer-Ceramic-Capacitors-MLCC---SMD-SMT_Murata-Electronics-Murata-Electronics-GJM1555C1H7R5BB01D_C497526.html
footprint CAP-0402 (0402 (1005M) Capacitor)
pins: 1, 2

## GJM1555C1H7R5WB01D
designator C?  Capacitance: 7.5pF  (hidden comment: *)
Capacitor, Ceramic (MLCC), 7.5pF, 50V, C0G, SMD 0402; Manufacturer: Murata Electronics; Manufacturer Part Number: GJM1555C1H7R5WB01D; Package Size: 0402; JLCPCB Basic Part: No; JLCPCB Part Number: C161334; Supplier 1: LCSC; Category: Capacitors - MLCC; Supplier Part Number 1: C161334; Voltage Rating: 50V; Temperature Coefficient: C0G; RoHS: Yes; ComponentLink1Description: Datasheet; ComponentLink1URL: https://wmsc.lcsc.com/wmsc/upload/file/pdf/v2/lcsc/2304140030_Murata-Electronics-GJM1555C1H7R5WB01D_C161334.pdf; ComponentLink2Description: JLCPCB Part URL; ComponentLink2URL: https://jlcpcb.com/partdetail/C161334; ComponentLink3Description: LCSC Part URL; ComponentLink3URL: https://lcsc.com/product-detail/Multilayer-Ceramic-Capacitors-MLCC---SMD-SMT_Murata-Electronics-Murata-Electronics-GJM1555C1H7R5WB01D_C161334.html
footprint CAP-0402 (0402 (1005M) Capacitor)
pins: 1, 2

## GJM1555C1H8R0BB01D
designator C?  Capacitance: 8pF  (hidden comment: *)
Capacitor, Ceramic (MLCC), 8pF, 50V, C0G, SMD 0402; Manufacturer: Murata Electronics; Manufacturer Part Number: GJM1555C1H8R0BB01D; Package Size: 0402; JLCPCB Basic Part: No; JLCPCB Part Number: C161335; Supplier 1: LCSC; Category: Capacitors - MLCC; Supplier Part Number 1: C161335; Voltage Rating: 50V; Temperature Coefficient: C0G; RoHS: Yes; ComponentLink1Description: Datasheet; ComponentLink1URL: https://wmsc.lcsc.com/wmsc/upload/file/pdf/v2/lcsc/2304140030_Murata-Electronics-GJM1555C1H8R0BB01D_C161335.pdf; ComponentLink2Description: JLCPCB Part URL; ComponentLink2URL: https://jlcpcb.com/partdetail/C161335; ComponentLink3Description: LCSC Part URL; ComponentLink3URL: https://lcsc.com/product-detail/Multilayer-Ceramic-Capacitors-MLCC---SMD-SMT_Murata-Electronics-Murata-Electronics-GJM1555C1H8R0BB01D_C161335.html
footprint CAP-0402 (0402 (1005M) Capacitor)
pins: 1, 2

## GJM1555C1H8R0CB01D
designator C?  Capacitance: 8pF  (hidden comment: *)
Capacitor, Ceramic (MLCC), 8pF, null, null, SMD 0402; Manufacturer: Murata Electronics; Manufacturer Part Number: GJM1555C1H8R0CB01D; Package Size: 0402; JLCPCB Basic Part: No; JLCPCB Part Number: C521082; Supplier 1: LCSC; Category: Capacitors - MLCC; Supplier Part Number 1: C521082; Voltage Rating: null; Temperature Coefficient: null; RoHS: Yes; ComponentLink1Description: Datasheet; ComponentLink1URL: https://wmsc.lcsc.com/wmsc/upload/file/pdf/v2/lcsc/2012181237_Murata-Electronics-GJM1555C1H8R0CB01D_C521082.pdf; ComponentLink2Description: JLCPCB Part URL; ComponentLink2URL: https://jlcpcb.com/partdetail/C521082; ComponentLink3Description: LCSC Part URL; ComponentLink3URL: https://lcsc.com/product-detail/Multilayer-Ceramic-Capacitors-MLCC---SMD-SMT_Murata-Electronics-Murata-Electronics-GJM1555C1H8R0CB01D_C521082.html
footprint CAP-0402 (0402 (1005M) Capacitor)
pins: 1, 2

## GJM1555C1H8R2BB01D
designator C?  Capacitance: 8.2pF  (hidden comment: *)
Capacitor, Ceramic (MLCC), 8.2pF, 50V, C0G, SMD 0402; Manufacturer: Murata Electronics; Manufacturer Part Number: GJM1555C1H8R2BB01D; Package Size: 0402; JLCPCB Basic Part: No; JLCPCB Part Number: C161336; Supplier 1: LCSC; Category: Capacitors - MLCC; Supplier Part Number 1: C161336; Voltage Rating: 50V; Temperature Coefficient: C0G; RoHS: Yes; ComponentLink1Description: Datasheet; ComponentLink1URL: https://wmsc.lcsc.com/wmsc/upload/file/pdf/v2/lcsc/1811081516_Murata-Electronics-GJM1555C1H8R2BB01D_C161336.pdf; ComponentLink2Description: JLCPCB Part URL; ComponentLink2URL: https://jlcpcb.com/partdetail/C161336; ComponentLink3Description: LCSC Part URL; ComponentLink3URL: https://lcsc.com/product-detail/Multilayer-Ceramic-Capacitors-MLCC---SMD-SMT_Murata-Electronics-Murata-Electronics-GJM1555C1H8R2BB01D_C161336.html
footprint CAP-0402 (0402 (1005M) Capacitor)
pins: 1, 2

## GJM1555C1H8R2CB01D
designator C?  Capacitance: 8.2pF  (hidden comment: *)
Capacitor, Ceramic (MLCC), 8.2pF, 50V, C0G, SMD 0402; Manufacturer: Murata Electronics; Manufacturer Part Number: GJM1555C1H8R2CB01D; Package Size: 0402; JLCPCB Basic Part: No; JLCPCB Part Number: C88898; Supplier 1: LCSC; Category: Capacitors - MLCC; Supplier Part Number 1: C88898; Voltage Rating: 50V; Temperature Coefficient: C0G; RoHS: Yes; ComponentLink1Description: Datasheet; ComponentLink1URL: https://wmsc.lcsc.com/wmsc/upload/file/pdf/v2/lcsc/2304140030_Murata-Electronics-GJM1555C1H8R2CB01D_C88898.pdf; ComponentLink2Description: JLCPCB Part URL; ComponentLink2URL: https://jlcpcb.com/partdetail/C88898; ComponentLink3Description: LCSC Part URL; ComponentLink3URL: https://lcsc.com/product-detail/Multilayer-Ceramic-Capacitors-MLCC---SMD-SMT_Murata-Electronics-Murata-Electronics-GJM1555C1H8R2CB01D_C88898.html
footprint CAP-0402 (0402 (1005M) Capacitor)
pins: 1, 2

## GJM1555C1H9R0BB01D
designator C?  Capacitance: 9pF  (hidden comment: *)
Capacitor, Ceramic (MLCC), 9pF, 50V, C0G, SMD 0402; Manufacturer: Murata Electronics; Manufacturer Part Number: GJM1555C1H9R0BB01D; Package Size: 0402; JLCPCB Basic Part: No; JLCPCB Part Number: C88899; Supplier 1: LCSC; Category: Capacitors - MLCC; Supplier Part Number 1: C88899; Voltage Rating: 50V; Temperature Coefficient: C0G; RoHS: Yes; ComponentLink1Description: Datasheet; ComponentLink1URL: https://wmsc.lcsc.com/wmsc/upload/file/pdf/v2/lcsc/2304140030_Murata-Electronics-GJM1555C1H9R0BB01D_C88899.pdf; ComponentLink2Description: JLCPCB Part URL; ComponentLink2URL: https://jlcpcb.com/partdetail/C88899; ComponentLink3Description: LCSC Part URL; ComponentLink3URL: https://lcsc.com/product-detail/Multilayer-Ceramic-Capacitors-MLCC---SMD-SMT_Murata-Electronics-Murata-Electronics-GJM1555C1H9R0BB01D_C88899.html
footprint CAP-0402 (0402 (1005M) Capacitor)
pins: 1, 2

## GJM1555C1H9R0CB01D
designator C?  Capacitance: 9pF  (hidden comment: *)
Capacitor, Ceramic (MLCC), 9pF, 50V, C0G, SMD 0402; Manufacturer: Murata Electronics; Manufacturer Part Number: GJM1555C1H9R0CB01D; Package Size: 0402; JLCPCB Basic Part: No; JLCPCB Part Number: C85884; Supplier 1: LCSC; Category: Capacitors - MLCC; Supplier Part Number 1: C85884; Voltage Rating: 50V; Temperature Coefficient: C0G; RoHS: Yes; ComponentLink1Description: Datasheet; ComponentLink1URL: https://wmsc.lcsc.com/wmsc/upload/file/pdf/v2/lcsc/2304140030_Murata-Electronics-GJM1555C1H9R0CB01D_C85884.pdf; ComponentLink2Description: JLCPCB Part URL; ComponentLink2URL: https://jlcpcb.com/partdetail/C85884; ComponentLink3Description: LCSC Part URL; ComponentLink3URL: https://lcsc.com/product-detail/Multilayer-Ceramic-Capacitors-MLCC---SMD-SMT_Murata-Electronics-Murata-Electronics-GJM1555C1H9R0CB01D_C85884.html
footprint CAP-0402 (0402 (1005M) Capacitor)
pins: 1, 2

## GJM1555C1H9R1BB01D
designator C?  Capacitance: 9.1pF  (hidden comment: *)
Capacitor, Ceramic (MLCC), 9.1pF, 50V, C0G, SMD 0402; Manufacturer: Murata Electronics; Manufacturer Part Number: GJM1555C1H9R1BB01D; Package Size: 0402; JLCPCB Basic Part: No; JLCPCB Part Number: C497527; Supplier 1: LCSC; Category: Capacitors - MLCC; Supplier Part Number 1: C497527; Voltage Rating: 50V; Temperature Coefficient: C0G; RoHS: Yes; ComponentLink1Description: Datasheet; ComponentLink1URL: https://wmsc.lcsc.com/wmsc/upload/file/pdf/v2/lcsc/2304140030_Murata-Electronics-GJM1555C1H9R1BB01D_C497527.pdf; ComponentLink2Description: JLCPCB Part URL; ComponentLink2URL: https://jlcpcb.com/partdetail/C497527; ComponentLink3Description: LCSC Part URL; ComponentLink3URL: https://lcsc.com/product-detail/Multilayer-Ceramic-Capacitors-MLCC---SMD-SMT_Murata-Electronics-Murata-Electronics-GJM1555C1H9R1BB01D_C497527.html
footprint CAP-0402 (0402 (1005M) Capacitor)
pins: 1, 2

## GJM1555C1H9R1DB01D
designator C?  Capacitance: 9.1pF  (hidden comment: *)
Capacitor, Ceramic (MLCC), 9.1pF, 50V, C0G, SMD 0402; Manufacturer: Murata Electronics; Manufacturer Part Number: GJM1555C1H9R1DB01D; Package Size: 0402; JLCPCB Basic Part: No; JLCPCB Part Number: C161337; Supplier 1: LCSC; Category: Capacitors - MLCC; Supplier Part Number 1: C161337; Voltage Rating: 50V; Temperature Coefficient: C0G; RoHS: Yes; ComponentLink1Description: Datasheet; ComponentLink1URL: https://wmsc.lcsc.com/wmsc/upload/file/pdf/v2/lcsc/1811081513_Murata-Electronics-GJM1555C1H9R1DB01D_C161337.pdf; ComponentLink2Description: JLCPCB Part URL; ComponentLink2URL: https://jlcpcb.com/partdetail/C161337; ComponentLink3Description: LCSC Part URL; ComponentLink3URL: https://lcsc.com/product-detail/Multilayer-Ceramic-Capacitors-MLCC---SMD-SMT_Murata-Electronics-Murata-Electronics-GJM1555C1H9R1DB01D_C161337.html
footprint CAP-0402 (0402 (1005M) Capacitor)
pins: 1, 2

## GJM1555C1H9R5BB01D
designator C?  Capacitance: 9.5pF  (hidden comment: *)
Capacitor, Ceramic (MLCC), 9.5pF, 50V, C0G, SMD 0402; Manufacturer: Murata Electronics; Manufacturer Part Number: GJM1555C1H9R5BB01D; Package Size: 0402; JLCPCB Basic Part: No; JLCPCB Part Number: C415396; Supplier 1: LCSC; Category: Capacitors - MLCC; Supplier Part Number 1: C415396; Voltage Rating: 50V; Temperature Coefficient: C0G; RoHS: Yes; ComponentLink1Description: Datasheet; ComponentLink1URL: https://wmsc.lcsc.com/wmsc/upload/file/pdf/v2/lcsc/2304140030_Murata-Electronics-GJM1555C1H9R5BB01D_C415396.pdf; ComponentLink2Description: JLCPCB Part URL; ComponentLink2URL: https://jlcpcb.com/partdetail/C415396; ComponentLink3Description: LCSC Part URL; ComponentLink3URL: https://lcsc.com/product-detail/Multilayer-Ceramic-Capacitors-MLCC---SMD-SMT_Murata-Electronics-Murata-Electronics-GJM1555C1H9R5BB01D_C415396.html
footprint CAP-0402 (0402 (1005M) Capacitor)
pins: 1, 2

## GJM1555C1H9R7CB01D
designator C?  Capacitance: 9.7pF  (hidden comment: *)
Capacitor, Ceramic (MLCC), 9.7pF, 50V, C0G, SMD 0402; Manufacturer: Murata Electronics; Manufacturer Part Number: GJM1555C1H9R7CB01D; Package Size: 0402; JLCPCB Basic Part: No; JLCPCB Part Number: C237287; Supplier 1: LCSC; Category: Capacitors - MLCC; Supplier Part Number 1: C237287; Voltage Rating: 50V; Temperature Coefficient: C0G; RoHS: Yes; ComponentLink1Description: Datasheet; ComponentLink1URL: https://wmsc.lcsc.com/wmsc/upload/file/pdf/v2/lcsc/1912111437_Murata-Electronics-GJM1555C1H9R7CB01D_C237287.pdf; ComponentLink2Description: JLCPCB Part URL; ComponentLink2URL: https://jlcpcb.com/partdetail/C237287; ComponentLink3Description: LCSC Part URL; ComponentLink3URL: https://lcsc.com/product-detail/Multilayer-Ceramic-Capacitors-MLCC---SMD-SMT_Murata-Electronics-Murata-Electronics-GJM1555C1H9R7CB01D_C237287.html
footprint CAP-0402 (0402 (1005M) Capacitor)
pins: 1, 2

## GJM1555C1H100FB01D
designator C?  Capacitance: 10pF  (hidden comment: *)
Capacitor, Ceramic (MLCC), 10pF, ±1%, null, null, ±1%, SMD 0402; Manufacturer: Murata Electronics; Manufacturer Part Number: GJM1555C1H100FB01D; Package Size: 0402; JLCPCB Basic Part: No; JLCPCB Part Number: C782046; Supplier 1: LCSC; Category: Capacitors - MLCC; Supplier Part Number 1: C782046; Tolerance: ±1%; Voltage Rating: null; Temperature Coefficient: null; RoHS: Yes; ComponentLink1Description: Datasheet; ComponentLink1URL: https://wmsc.lcsc.com/wmsc/upload/file/pdf/v2/lcsc/2009121209_Murata-Electronics-GJM1555C1H100FB01D_C782046.pdf; ComponentLink2Description: JLCPCB Part URL; ComponentLink2URL: https://jlcpcb.com/partdetail/C782046; ComponentLink3Description: LCSC Part URL; ComponentLink3URL: https://lcsc.com/product-detail/Multilayer-Ceramic-Capacitors-MLCC---SMD-SMT_Murata-Electronics-Murata-Electronics-GJM1555C1H100FB01D_C782046.html
footprint CAP-0402 (0402 (1005M) Capacitor)
pins: 1, 2

## GJM1555C1H100GB01D
designator C?  Capacitance: 10pF  (hidden comment: *)
Capacitor, Ceramic (MLCC), 10pF, ±2%, 50V, C0G, ±2%, SMD 0402; Manufacturer: Murata Electronics; Manufacturer Part Number: GJM1555C1H100GB01D; Package Size: 0402; JLCPCB Basic Part: No; JLCPCB Part Number: C85873; Supplier 1: LCSC; Category: Capacitors - MLCC; Supplier Part Number 1: C85873; Tolerance: ±2%; Voltage Rating: 50V; Temperature Coefficient: C0G; RoHS: Yes; ComponentLink1Description: Datasheet; ComponentLink1URL: https://wmsc.lcsc.com/wmsc/upload/file/pdf/v2/lcsc/2304140030_Murata-Electronics-GJM1555C1H100GB01D_C85873.pdf; ComponentLink2Description: JLCPCB Part URL; ComponentLink2URL: https://jlcpcb.com/partdetail/C85873; ComponentLink3Description: LCSC Part URL; ComponentLink3URL: https://lcsc.com/product-detail/Multilayer-Ceramic-Capacitors-MLCC---SMD-SMT_Murata-Electronics-Murata-Electronics-GJM1555C1H100GB01D_C85873.html
footprint CAP-0402 (0402 (1005M) Capacitor)
pins: 1, 2

## GJM1555C1H100JB01D
designator C?  Capacitance: 10pF  (hidden comment: *)
Capacitor, Ceramic (MLCC), 10pF, ±5%, 50V, C0G, ±5%, SMD 0402; Manufacturer: Murata Electronics; Manufacturer Part Number: GJM1555C1H100JB01D; Package Size: 0402; JLCPCB Basic Part: No; JLCPCB Part Number: C85874; Supplier 1: LCSC; Category: Capacitors - MLCC; Supplier Part Number 1: C85874; Tolerance: ±5%; Voltage Rating: 50V; Temperature Coefficient: C0G; RoHS: Yes; ComponentLink1Description: Datasheet; ComponentLink1URL: https://wmsc.lcsc.com/wmsc/upload/file/pdf/v2/lcsc/2304140030_Murata-Electronics-GJM1555C1H100JB01D_C85874.pdf; ComponentLink2Description: JLCPCB Part URL; ComponentLink2URL: https://jlcpcb.com/partdetail/C85874; ComponentLink3Description: LCSC Part URL; ComponentLink3URL: https://lcsc.com/product-detail/Multilayer-Ceramic-Capacitors-MLCC---SMD-SMT_Murata-Electronics-Murata-Electronics-GJM1555C1H100JB01D_C85874.html
footprint CAP-0402 (0402 (1005M) Capacitor)
pins: 1, 2
